# Altium footprint library MainFPs.PcbLib: 206 footprints (part 13 of 13)
Each footprint in its own frame and in the unit in brackets; x right, y up, seen from the top. Pads: shape width x height; smd on the part's side, far side on the other; paste and mask are expansions set on the pad; w line width, h text height; cw(c..) or ccw(c..) is an arc to the next point about the centre after c.
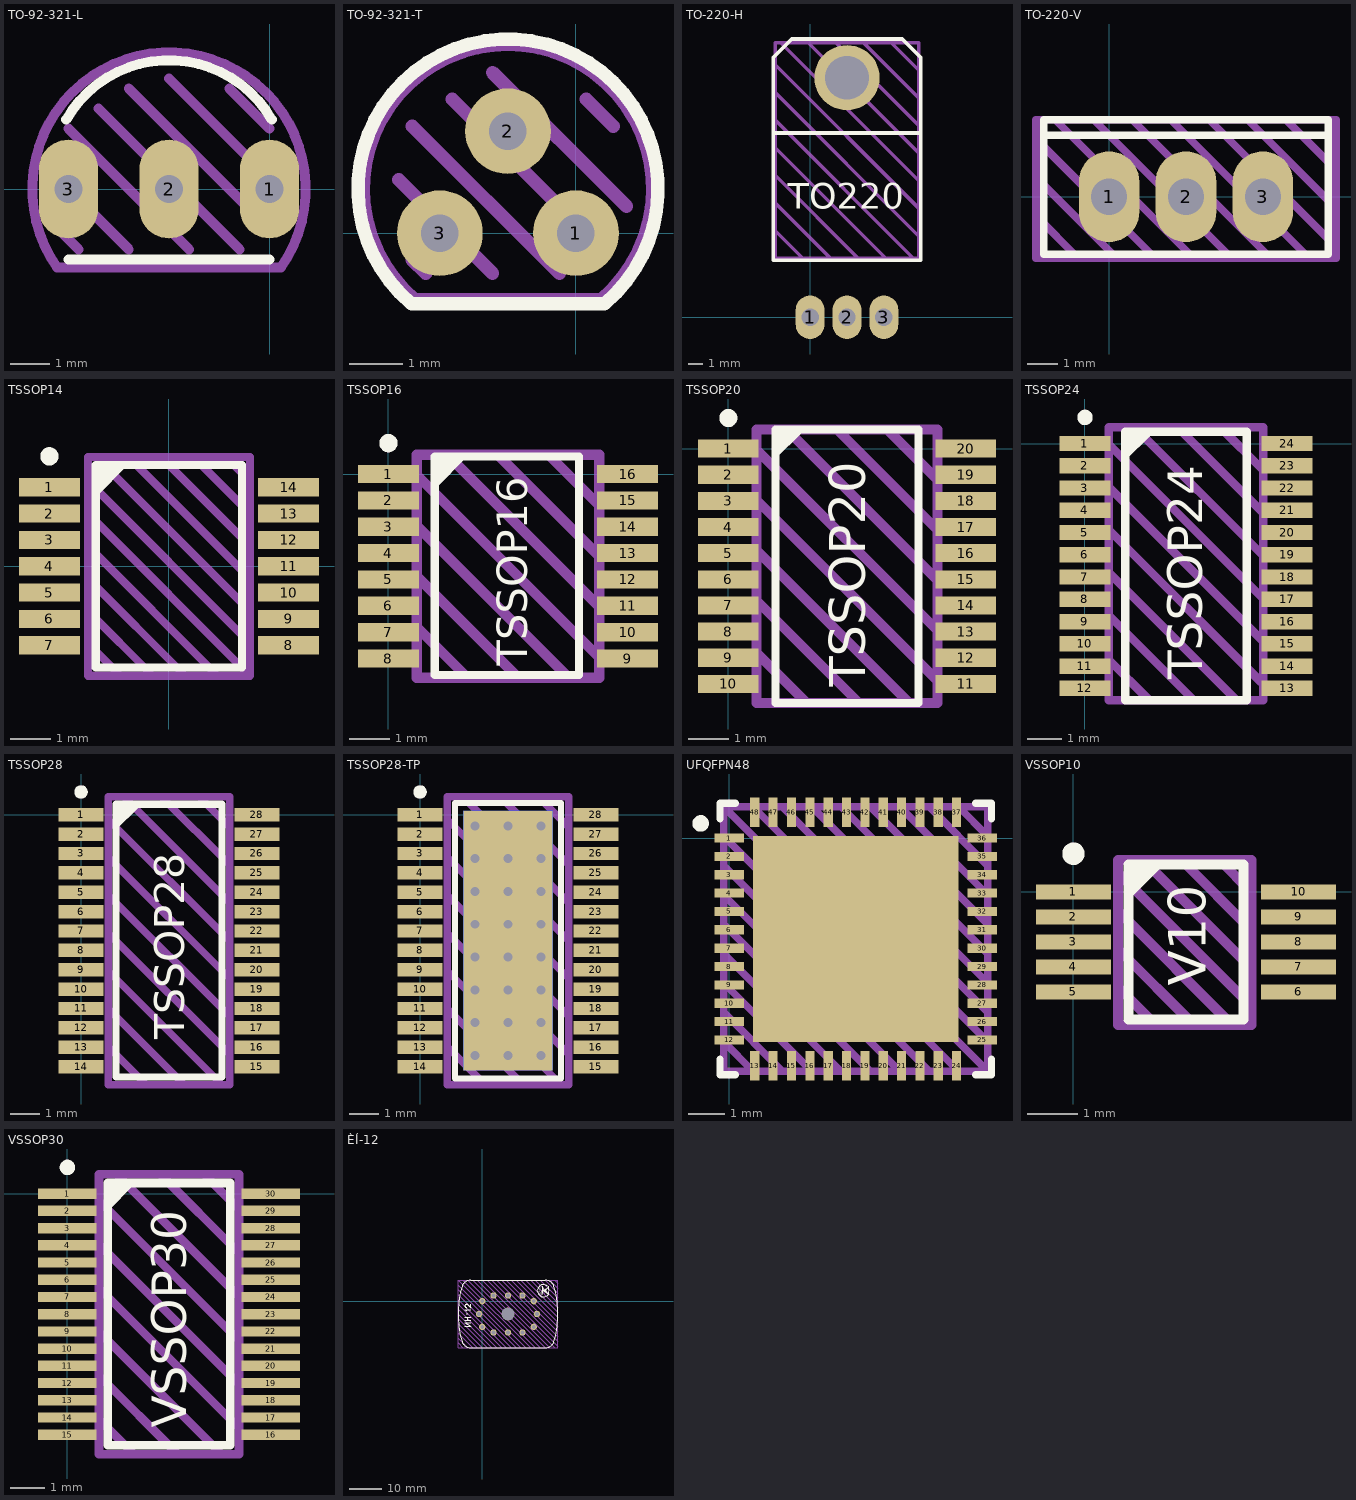
[diagram p12: the footprints below, top view; thin cyan lines are the x and y axes]

## TO-92-321-L [mm]
pads (3):
  oval 1.5x2.5 hole 0.7: 1(0,0) 2(-2.54,0) 3(-5.08,0)
Top Overlay:
  lines w0.25: -5.138,1.754 cw(c-2.54,0.254) 0.058,1.754 ; -5.08,-1.778 0,-1.778
Draw:
  lines w0.25: -5.334,-1.016 -4.826,-1.524 ; -5.334,0.254 -3.556,-1.524 ; -5.08,1.524 -2.032,-1.524 ; -4.318,2.032 -0.762,-1.524 ; -3.556,2.54 0,-1.016 ; -2.54,2.794 0.254,0 ; -1.016,2.54 0,1.524 ; -5.37,-1.982 cw(c-2.54,0) 0.29,-1.982 -5.37,-1.982
Info:
  text "'.Comment'" at -5.715,-3.175 h0.75
3D body: height 2.18, standoff -0.16, extent -5.365,-0.3 -3.555,0.3
3D body: height 3, standoff 2, extent -1.57,-0.3 -0.97,0.3
3D body: height 3, standoff 2, extent -4.109,-0.3 -3.509,0.3
3D body: height 0.3, standoff -0.3, extent -0.299,-0.3 0.301,0.3
3D body: height 0.3, standoff -0.3, extent -5.379,-0.3 -4.779,0.3
3D body: height 5.22, standoff -1.78, extent -2.839,-0.3 -2.239,0.3
3D body: height 0, standoff -1.78, extent -0.299,-0.3 0.301,0.3
3D body: height 0, standoff -1.78, extent -5.379,-0.3 -4.779,0.3
3D body: height 2.3, standoff 1.7, extent -1.57,-0.3 -0.97,0.3
3D body: height 2.3, standoff 1.7, extent -4.109,-0.3 -3.509,0.3
3D body: height 2.18, standoff -0.16, extent -1.525,-0.3 0.285,0.3
3D body: height 7, standoff 3, extent -5.058,-1.422 -2.537,2.997
3D body: height 7, standoff 3, extent -2.54,-1.422 -0.019,2.997

## TO-92-321-T [mm]
pads (3):
  round 1.6 hole 0.7: 1(0,0) 2(-1.27,1.905) 3(-2.54,0)
Top Overlay:
  lines w0.25: -3.068,-1.319 cw(c-1.269,0.826) 0.531,-1.319 -3.068,-1.319
Draw:
  lines w0.25: -3.307,1 -1.557,-0.75 ; -3.057,-0.5 -2.807,-0.75 ; -3.057,2 -0.307,-0.75 ; -2.307,2.5 0.443,-0.25 ; -1.557,3 0.943,0.5 ; 0.193,2.5 0.693,2 ; -2.807,-0.75 -2.807,-0.75 ; -3.004,-1.243 cw(c-1.269,0.826) 0.467,-1.243 -3.004,-1.243
Info:
  text "'.Comment'" at -4.445,-2.54 h0.75
3D body: height 7, standoff 3, extent -3.79,-0.787 -1.268,3.632
3D body: height 7, standoff 3, extent -1.271,-0.787 1.25,3.632
3D body: height 2.17, standoff -0.13, extent -1.569,0.682 -0.969,2.177
3D body: height 2.16, standoff -0.13, extent -2.84,-0.27 -2.24,1.246
3D body: height 0, standoff -1.78, extent -0.3,-0.3 0.3,0.3
3D body: height 0.3, standoff -0.3, extent -0.3,-0.3 0.3,0.3
3D body: height 0, standoff -1.78, extent -2.84,-0.3 -2.24,0.3
3D body: height 0.3, standoff -0.3, extent -2.84,-0.3 -2.24,0.3
3D body: height 2.3, standoff 1.7, extent -1.57,0.665 -0.97,1.265
3D body: height 0.3, standoff -0.3, extent -1.569,1.605 -0.969,2.205
3D body: height 0, standoff -1.78, extent -1.569,1.605 -0.969,2.205
3D body: height 3, standoff 2, extent -0.301,0.665 0.299,1.265
3D body: height 3, standoff 2, extent -2.839,0.666 -2.239,1.266
3D body: height 3, standoff 2, extent -1.57,0.665 -0.97,1.265
3D body: height 2.3, standoff 1.7, extent -0.301,0.665 0.299,1.265
3D body: height 2.3, standoff 1.7, extent -2.839,0.666 -2.239,1.266
3D body: height 2.16, standoff -0.13, extent -0.3,-0.27 0.3,1.246

## TO-220-H [mm]
pads (4):
  oval 2x3 hole 1.2: 1(0,0) 2(2.54,0) 3(5.08,0)
  round 4.5 hole 3: ""(2.54,16.51)
Top Overlay:
  lines w0.25: -2.54,12.7 7.6,12.7 ; -2.54,3.937 7.62,3.937 7.62,17.907 6.35,19.177 -1.27,19.177 -2.54,17.907 -2.54,3.937
  text "TO220" at -1.555,7.462 h1.75
Draw:
  lines w0.25: -2.413,5.969 -0.508,4.064 ; -2.413,7.874 1.397,4.064 ; -2.413,9.779 3.302,4.064 ; -2.413,11.684 5.207,4.064 ; -2.413,13.589 7.112,4.064 ; -2.413,15.494 7.493,5.588 ; -2.413,17.399 7.429,7.556 ; -2.032,18.923 7.493,9.398 ; -0.127,18.923 7.461,11.335 ; 1.778,18.923 7.493,13.208 ; 3.683,18.923 7.493,15.113 ; 5.588,18.923 7.493,17.018 ; -2.413,4.064 7.493,4.064 7.493,18.669 7.493,18.923 -2.413,18.923 -2.413,4.064
Info:
  text "'.Comment'" at -2.413,-3.175 h1.25
3D body: height 1.27, standoff 0, extent -2.3,6.3 7.3,18.8
3D body: height 2.2, standoff 1.8, extent -0.762,-0.254 0.762,4
3D body: height 2.2, standoff 1.8, extent 1.778,-0.254 3.302,4
3D body: height 2.2, standoff 1.8, extent 4.318,-0.254 5.842,4
3D body: height 2, standoff -1.78, extent -0.254,-0.254 0.254,0.254
3D body: height 2, standoff -1.78, extent 2.286,-0.254 2.794,0.254
3D body: height 3, standoff 0.01, extent -2.6,3.999 7.6,12.7
3D body: height 2, standoff -1.78, extent 4.826,-0.254 5.334,0.254

## TO-220-V [mm]
pads (3):
  oval 2x3 hole 1.2: 1(0,0) 2(2.54,0) 3(5.08,0)
Top Overlay:
  lines w0.25: -2.159,2.032 0,2.032 5.08,2.032 7.239,2.032 ; -2.159,-1.905 0,-1.905 5.08,-1.905 7.239,-1.905 7.239,2.54 -2.159,2.54 -2.159,0.921 -2.159,-1.048 -2.159,-1.905
Draw:
  lines w0.25: -2.413,-0.635 -1.016,-2.032 0.254,-2.032 -2.413,0.635 ; -2.413,1.778 -2.413,2.54 -2.286,2.54 0,2.54 ; -2.413,1.905 1.524,-2.032 2.794,-2.032 -1.778,2.54 ; -2.413,2.032 -2.413,1.016 -2.413,-1.016 -2.413,-2.032 7.493,-2.032 7.493,2.54 5.08,2.54 ; -1.27,2.54 0,2.54 ; -0.508,2.54 3.81,-1.778 4.064,-2.032 ; 0.508,2.54 0.762,2.54 5.334,-2.032 ; 1.27,2.54 2.54,2.54 ; 2.032,2.54 6.604,-2.032 ; 3.302,2.54 7.493,-1.651 ; 3.81,2.54 5.08,2.54 ; 4.572,2.54 7.493,-0.381 7.493,0.889 5.842,2.54 ; 0,2.54 5.08,2.54
Info:
  text "'.Comment'" at -2.286,-3.556 h1
3D body: height 13, standoff 3.9, extent -2.575,-0.819 7.625,2.237
3D body: height 4, standoff 0.49, extent 4.445,-0.381 5.715,0.381
3D body: height 4, standoff 0.49, extent 1.905,-0.381 3.175,0.381
3D body: height 0.5, standoff -3, extent 4.699,-0.254 5.461,0.254
3D body: height 0.5, standoff -3, extent 2.159,-0.254 2.921,0.254
3D body: height 0.5, standoff -3, extent -0.381,-0.254 0.381,0.254
3D body: height 4, standoff 0.49, extent -0.635,-0.381 0.635,0.381
3D body: height 18.75, standoff 6.25, extent -2.275,0.989 7.325,2.259

## TSSOP14 [mm]
height 1.2
pads (14):
  rect 1.5x0.45 smd: 1(-2.95,1.95) 2(-2.95,1.3) 3(-2.95,0.65) 4(-2.95,0) 5(-2.95,-0.65) 6(-2.95,-1.3) 7(-2.95,-1.95) 8(2.95,-1.95) 9(2.95,-1.3) 10(2.95,-0.65) 11(2.95,0) 12(2.95,0.65) 13(2.95,1.3) 14(2.95,1.95)
Top Overlay:
  circle w0.25: c-2.95,2.712 r0.1
  region: -1.807,2.5 -1.807,1.706 -1.013,2.5
  lines w0.2: -1.807,-2.5 1.8,-2.5 1.8,2.5 -1.807,2.5 -1.807,-2.5
Draw:
  lines w0.2: -2,-1.9 -1.2,-2.7 ; -2,-1.1 -0.4,-2.7 ; -2,-0.3 0.4,-2.7 ; -2,0.5 1.2,-2.7 ; -2,1.3 2,-2.7 ; -2,2.1 2,-1.9 ; -1.8,2.7 2,-1.1 ; -1,2.7 2,-0.3 ; -0.2,2.7 2,0.5 ; 0.6,2.7 2,1.3 ; 1.4,2.7 2,2.1 ; 2,-2.7 2,2.7 -2,2.7 -2,-2.7 2,-2.7
Info:
  text "'.Comment'" at -3.204,-3.638 h0.75
3D body "TSOP65P640X120-14N.step": height 1.2, standoff 0, extent -3.2,-2.7 3.2,2.7

## TSSOP16 [mm]
height 1.2
pads (16):
  rect 1.5x0.45 smd: 1(0,0) 2(0,-0.65) 3(0,-1.3) 4(0,-1.95) 5(0,-2.6) 6(0,-3.25) 7(0,-3.9) 8(0,-4.55) 9(5.9,-4.55) 10(5.9,-3.9) 11(5.9,-3.25) 12(5.9,-2.6) 13(5.9,-1.95) 14(5.9,-1.3) 15(5.9,-0.65) 16(5.9,0)
Top Overlay:
  circle w0.25: c0,0.762 r0.1
  region: 1.15,0.435 1.15,-0.359 1.944,0.435
  lines w0.2: 1.143,-4.953 4.699,-4.953 4.699,0.435 1.143,0.435 1.143,-4.953
  text "TSSOP16" at 3.423,-4.723 h0.75
Draw:
  lines w0.25: 0.7,-3.775 1.95,-5.025 ; 0.7,-2.525 3.2,-5.025 3.45,-5.025 ; 0.7,-1.275 4.45,-5.025 ; 0.7,-0.025 5.2,-4.525 ; 1.45,0.475 5.2,-3.275 5.2,-4.525 ; 2.7,0.475 5.2,-2.025 5.2,-3.525 ; 3.991,0.435 5.2,-0.775 5.2,-1.275 ; 5.2,-5.025 0.7,-5.025 0.7,0.475 5.2,0.475 5.2,-5.025 ; 5.2,-5.025 5.2,-4.525
Info:
  text "'.Comment'" at -0.254,-6.096 h0.75
3D body "TSSOP16.step": height 1.2, standoff 0, extent -0.3,-4.825 6.2,0.275

## TSSOP20 [mm]
height 1.3
pads (20):
  rect 1.5x0.45 smd: 1(0,0) 2(0,-0.65) 3(0,-1.3) 4(0,-1.95) 5(0,-2.6) 6(0,-3.25) 7(0,-3.9) 8(0,-4.55) 9(0,-5.2) 10(0,-5.85) 11(5.9,-5.85) 12(5.9,-5.2) 13(5.9,-4.55) 14(5.9,-3.9) 15(5.9,-3.25) 16(5.9,-2.6) 17(5.9,-1.95) 18(5.9,-1.3) 19(5.9,-0.65) 20(5.9,0)
Top Overlay:
  circle w0.25: c0,0.762 r0.1
  region: 1.1,0.475 1.1,-0.319 1.894,0.475
  lines w0.2: 1.172,-6.325 1.172,0.475 4.728,0.475 4.728,-6.325 1.172,-6.325
  text "TSSOP20" at 3.4,-5.924 h0.9
Draw:
  lines w0.25: 0.7,-4.925 0.7,-5.075 0.8,-5.175 1.95,-6.325 ; 0.7,-3.775 3.25,-6.325 3.45,-6.325 ; 0.7,-2.525 4.475,-6.3 ; 0.7,-1.275 5.15,-5.725 ; 0.7,-0.025 5.2,-4.525 ; 1.45,0.475 5.2,-3.275 5.2,-4.525 ; 2.7,0.475 5.2,-2.025 5.2,-3.525 ; 3.95,0.475 5.2,-0.775 5.2,-1.275 ; 5.2,-5.025 5.2,0.475 0.7,0.475 0.7,-6.325 5.2,-6.325 5.2,-4.525
Info:
  text "'.Comment'" at -0.186,-7.537 h0.75
3D body "TSOP65P640X120-16N.step": height 1.2, standoff 0, extent -0.275,-4.775 6.125,0.225
3D body "TSOP65P640X120-16N.step": height 1.2, standoff 0, extent -0.275,-6.075 6.125,-1.075

## TSSOP24 [mm]
height 1.2
pads (24):
  rect 1.5x0.45 smd: 1(0,0) 2(0,-0.65) 3(0,-1.3) 4(0,-1.95) 5(0,-2.6) 6(0,-3.25) 7(0,-3.9) 8(0,-4.55) 9(0,-5.2) 10(0,-5.85) 11(0,-6.5) 12(0,-7.15) 13(5.9,-7.15) 14(5.9,-6.5) 15(5.9,-5.85) 16(5.9,-5.2) 17(5.9,-4.55) 18(5.9,-3.9) 19(5.9,-3.25) 20(5.9,-2.6) 21(5.9,-1.95) 22(5.9,-1.3) 23(5.9,-0.65) 24(5.9,0)
Top Overlay:
  circle w0.25: c0,0.762 r0.1
  region: 1.15,0.275 1.15,-0.519 1.944,0.275
  lines w0.25: 1.172,-7.493 1.172,0.347 4.728,0.347 4.728,-7.493 1.172,-7.493
  text "TSSOP24" at 3.421,-6.888 h1
Draw:
  lines w0.25: 0.7,-6.325 1.861,-7.486 ; 0.7,-5.075 0.7,-4.925 ; 0.7,-5.025 3.168,-7.493 3.302,-7.493 ; 0.7,-3.775 4.419,-7.494 ; 0.7,-2.525 5.15,-6.975 ; 0.7,-1.275 5.15,-5.725 ; 0.7,-0.025 5.2,-4.525 ; 1.45,0.475 5.2,-3.275 5.2,-4.525 ; 2.7,0.475 5.2,-2.025 5.2,-3.525 ; 3.95,0.475 5.2,-0.775 5.2,-1.275 ; 5.2,-5.025 5.2,0.475 0.7,0.475 0.7,-7.493 5.2,-7.493 5.2,-4.525
Info:
  text "'.Comment'" at -0.186,-8.637 h0.75
3D body "TSOP65P640X120-24N.step": height 1.2, standoff 0, extent -0.25,-7.525 6.15,0.375

## TSSOP28 [mm]
height 1.2
pads (28):
  rect 1.5x0.45 smd: 1(0,0) 2(0,-0.65) 3(0,-1.3) 4(0,-1.95) 5(0,-2.6) 6(0,-3.25) 7(0,-3.9) 8(0,-4.55) 9(0,-5.2) 10(0,-5.85) 11(0,-6.5) 12(0,-7.15) 13(0,-7.8) 14(0,-8.45) 15(5.9,-8.45) 16(5.9,-7.8) 17(5.9,-7.15) 18(5.9,-6.5) 19(5.9,-5.85) 20(5.9,-5.2) 21(5.9,-4.55) 22(5.9,-3.9) 23(5.9,-3.25) 24(5.9,-2.6) 25(5.9,-1.95) 26(5.9,-1.3) 27(5.9,-0.65) 28(5.9,0)
Top Overlay:
  circle w0.25: c0,0.762 r0.1
  region: 1.15,0.275 1.15,-0.519 1.944,0.275
  lines w0.25: 1.172,-8.797 1.172,0.347 4.728,0.347 4.728,-8.797 1.172,-8.797
  text "TSSOP28" at 3.458,-7.527 h1
Draw:
  lines w0.25: 0.918,-7.781 2.188,-9.051 ; 0.918,-6.511 3.458,-9.051 ; 0.918,-5.241 4.728,-9.051 ; 0.918,-3.971 4.982,-8.035 ; 0.918,-2.701 4.982,-6.765 ; 0.918,-1.431 4.982,-5.495 ; 0.918,-0.161 4.982,-4.225 ; 1.426,0.601 4.982,-2.955 ; 2.696,0.601 4.982,-1.685 ; 3.966,0.601 4.982,-0.415 ; 0.918,-9.051 0.918,0.347 0.918,0.601 1.172,0.601 4.982,0.601 4.982,-9.051 0.918,-9.051
Info:
  text "'.Comment'" at -0.186,-10.237 h0.75
3D body "TSSOP28.step": height 1.2, standoff 0, extent -0.25,-9.125 6.15,0.675

## TSSOP28-TP [mm]
height 1.2
pads (30):
  rect 1.5x0.45 smd: 1(0,0) 2(0,-0.65) 3(0,-1.3) 4(0,-1.95) 5(0,-2.6) 6(0,-3.25) 7(0,-3.9) 8(0,-4.55) 9(0,-5.2) 10(0,-5.85) 11(0,-6.5) 12(0,-7.15) 13(0,-7.8) 14(0,-8.45) 15(5.9,-8.45) 16(5.9,-7.8) 17(5.9,-7.15) 18(5.9,-6.5) 19(5.9,-5.85) 20(5.9,-5.2) 21(5.9,-4.55) 22(5.9,-3.9) 23(5.9,-3.25) 24(5.9,-2.6) 25(5.9,-1.95) 26(5.9,-1.3) 27(5.9,-0.65) 28(5.9,0)
  rect 3x8.7 smd: ""(2.95,-4.225)
  rect 3x8.7 smd far side: ""(2.95,-4.225)
via 1.85,-0.375 diameter 0.5 hole 0.3
via 2.95,-0.375 diameter 0.5 hole 0.3
via 4.05,-0.375 diameter 0.5 hole 0.3
via 2.95,-1.475 diameter 0.5 hole 0.3
via 4.05,-1.475 diameter 0.5 hole 0.3
via 2.95,-2.575 diameter 0.5 hole 0.3
via 4.05,-2.575 diameter 0.5 hole 0.3
via 4.05,-3.675 diameter 0.5 hole 0.3
via 4.05,-4.775 diameter 0.5 hole 0.3
via 4.05,-5.875 diameter 0.5 hole 0.3
via 4.05,-6.975 diameter 0.5 hole 0.3
via 4.05,-8.075 diameter 0.5 hole 0.3
via 1.85,-5.875 diameter 0.5 hole 0.3
via 1.85,-1.475 diameter 0.5 hole 0.3
via 1.85,-2.575 diameter 0.5 hole 0.3
via 1.85,-3.675 diameter 0.5 hole 0.3
via 1.85,-4.775 diameter 0.5 hole 0.3
via 1.85,-6.975 diameter 0.5 hole 0.3
via 1.85,-8.075 diameter 0.5 hole 0.3
via 2.95,-8.075 diameter 0.5 hole 0.3
via 2.95,-3.675 diameter 0.5 hole 0.3
via 2.95,-4.775 diameter 0.5 hole 0.3
via 2.95,-5.875 diameter 0.5 hole 0.3
via 2.95,-6.975 diameter 0.5 hole 0.3
Top Overlay:
  circle w0.25: c0,0.762 r0.1
  lines w0.2: 1.172,-8.85 1.172,0.398 4.728,0.398 4.728,-8.85 1.172,-8.85
Draw:
  lines w0.25: 0.918,-7.781 2.188,-9.051 ; 0.918,-6.511 3.458,-9.051 ; 0.918,-5.241 4.728,-9.051 ; 0.918,-3.971 4.982,-8.035 ; 0.918,-2.701 4.982,-6.765 ; 0.918,-1.431 4.982,-5.495 ; 0.918,-0.161 4.982,-4.225 ; 1.426,0.601 4.982,-2.955 ; 2.696,0.601 4.982,-1.685 ; 3.966,0.601 4.982,-0.415 ; 0.918,-9.051 4.982,-9.051 4.982,0.601 1.172,0.601 0.918,0.601 0.918,0.347 0.918,-9.051
Info:
  text "'.Comment'" at -0.186,-10.237 h0.75
3D body "TSSOP-28.step": height 1.2, standoff 0, extent -0.25,-9.125 6.15,0.675

## UFQFPN48 [mm]
pads (49):
  rect 0.8x0.25 smd: 1(0,0) 2(0,-0.5) 3(0,-1) 4(0,-1.5) 5(0,-2) 6(0,-2.5) 7(0,-3) 8(0,-3.5) 9(0,-4) 10(0,-4.5) 11(0,-5) 12(0,-5.5) 25(6.9,-5.5) 26(6.9,-5) 27(6.9,-4.5) 28(6.9,-4) 29(6.9,-3.5) 30(6.9,-3) 31(6.9,-2.5) 32(6.9,-2) 33(6.9,-1.5) 34(6.9,-1) 35(6.9,-0.5) 36(6.9,0)
  rect 0.25x0.8 smd: 13(0.7,-6.2) 14(1.2,-6.2) 15(1.7,-6.2) 16(2.2,-6.2) 17(2.7,-6.2) 18(3.2,-6.2) 19(3.7,-6.2) 20(4.2,-6.2) 21(4.7,-6.2) 22(5.2,-6.2) 23(5.7,-6.2) 24(6.2,-6.2) 37(6.2,0.7) 38(5.7,0.7) 39(5.2,0.7) 40(4.7,0.7) 41(4.2,0.7) 42(3.7,0.7) 43(3.2,0.7) 44(2.7,0.7) 45(2.2,0.7) 46(1.7,0.7) 47(1.2,0.7) 48(0.7,0.7)
  rect 5.6x5.6 smd: ""(3.45,-2.75)
Top Overlay:
  circle w0.25: c-0.775,0.4 r0.1
  lines w0.2: -0.25,-6.025 -0.25,-6.45 0.175,-6.45 ; -0.25,0.525 -0.25,0.95 0.175,0.95 ; 6.725,-6.45 7.15,-6.45 7.15,-6.025 ; 6.725,0.95 7.15,0.95 7.15,0.525
Draw:
  lines w0.2: -0.15,-5.55 0.65,-6.35 ; -0.15,-4.75 1.45,-6.35 ; -0.15,-3.95 2.25,-6.35 ; -0.15,-3.15 3.05,-6.35 ; -0.15,-2.35 3.85,-6.35 ; -0.15,-1.55 4.65,-6.35 ; -0.15,-0.75 5.45,-6.35 ; -0.15,0.05 6.25,-6.35 ; 0.65,0.85 7.05,-5.55 ; 1.45,0.85 7.05,-4.75 ; 2.25,0.85 7.05,-3.95 ; 3.05,0.85 7.05,-3.15 ; 3.85,0.85 7.05,-2.35 ; 4.65,0.85 7.05,-1.55 ; 5.45,0.85 7.05,-0.75 ; 6.25,0.85 7.05,0.05 ; -0.15,0.85 -0.15,-6.35 7.05,-6.35 ; -0.15,0.85 7.05,0.85 7.05,-6.35 ; -0.15,0.85 7.05,-6.35
Info:
  text "'.Comment'" at 0.264,-7.787 h0.75
3D body "QFN50P700X700X60_HS-49N.step": height 0.6, standoff 0, extent -0.11,-6.31 7.01,0.81

## VSSOP10 [mm]
height 1.1
pads (10):
  rect 1.5x0.3 smd: 1(0,0) 2(0,-0.5) 3(0,-1) 4(0,-1.5) 5(0,-2) 6(4.5,-2) 7(4.5,-1.5) 8(4.5,-1) 9(4.5,-0.5) 10(4.5,0)
Top Overlay:
  circle w0.25: c0,0.762 r0.1
  region: 1.107,0.54 1.107,-0.163 1.81,0.54
  lines w0.2: 1.1,-2.55 3.4,-2.55 3.4,0.55 1.1,0.55 1.1,-2.55
  text "V10" at 2.644,-1.882 h0.75
Draw:
  lines w0.2: 0.889,-1.905 1.651,-2.667 ; 0.889,-1.143 2.413,-2.667 ; 0.889,-0.381 3.175,-2.667 ; 0.889,0.381 3.556,-2.286 ; 1.397,0.635 3.556,-1.524 ; 2.159,0.635 3.556,-0.762 ; 2.921,0.635 3.556,0 ; 0.889,-2.667 0.889,0.635 3.556,0.635 3.556,-2.667 0.889,-2.667
Info:
  text "'.Comment'" at 0.176,-3.492 h0.5
3D body "VSSOP10.step": height 1.1, standoff 0, extent -0.262,-2.55 4.763,0.55

## VSSOP30 [mm]
height 1.2
pads (30):
  rect 1.7x0.3 smd: 1(0,0) 2(0,-0.5) 3(0,-1) 4(0,-1.5) 5(0,-2) 6(0,-2.5) 7(0,-3) 8(0,-3.5) 9(0,-4) 10(0,-4.5) 11(0,-5) 12(0,-5.5) 13(0,-6) 14(0,-6.5) 15(0,-7) 16(5.9,-7) 17(5.9,-6.5) 18(5.9,-6) 19(5.9,-5.5) 20(5.9,-5) 21(5.9,-4.5) 22(5.9,-4) 23(5.9,-3.5) 24(5.9,-3) 25(5.9,-2.5) 26(5.9,-2) 27(5.9,-1.5) 28(5.9,-1) 29(5.9,-0.5) 30(5.9,0)
Top Overlay:
  circle w0.25: c0,0.762 r0.1
  region: 1.15,0.275 1.15,-0.519 1.944,0.275
  lines w0.25: 1.172,-7.31 4.728,-7.31 4.728,0.31 1.172,0.31 1.172,-7.31
  text "VSSOP30" at 3.458,-6.802 h1
Draw:
  lines w0.25: 0.918,-6.548 1.934,-7.564 ; 0.918,-5.278 3.204,-7.564 ; 0.918,-4.008 4.474,-7.564 ; 0.918,-2.738 4.982,-6.802 ; 0.918,-1.468 4.982,-5.532 ; 0.918,-0.198 4.982,-4.262 ; 1.426,0.564 4.982,-2.992 ; 2.696,0.564 4.982,-1.722 ; 3.966,0.564 4.982,-0.452 ; 0.918,-7.564 4.982,-7.564 4.982,0.564 1.172,0.564 0.918,0.564 0.918,0.31 0.918,-7.564
Info:
  text "'.Comment'" at -0.186,-8.637 h0.75
3D body "TSSOP30.step": height 1.2, standoff 0, extent -0.25,-7.45 6.15,0.45

## ÈÍ-12 [mm]
pads (13):
  round 2 hole 1.2: 1(0,0) 2(3.5,1.75) 3(8,1.75) 4(12.5,1.75) 5(16,0) 6(17,-4) 7(16,-8) 8(12.5,-9.75) 9(8,-9.75) 10(3.5,-9.75) 11(0,-8) 12(-1,-4)
  round 0 hole 4 unplated: ""(8,-4)
Top Layer:
  circle w0.2: c8,-4 r1.75
Top Overlay:
  region: 20.35,2.275 19,3.25 20.35,4.225 19.525,3.275
  region: 19,3.25 18.575,1.925 18.675,3.25 18.575,4.575
  lines w0.05: 19,3.25 18.575,1.925 18.675,3.25 18.575,4.575 19,3.25 ; 19,3.25 20.35,4.225 19.525,3.275 20.35,2.275 19,3.25
  lines w0.127: 17,3.25 cw(c20.655,2.048) 18.382,5.152 cw(c18.471,1.622) 20.618,4.426 cw(c15.448,3.25) 20.618,2.074 cw(c18.792,3.891) 18.382,1.348 cw(c20.655,4.453) 17,3.25
  lines w0.2: -5.375,-7.75 -3.625,-7.75 -5.375,-6.75 -3.625,-6.75 ; -5.375,-6 -3.625,-6 ; -5.375,-5 -3.625,-5 ; -4.875,-3 -5.375,-2.75 -3.625,-2.75 ; -4.875,-2 cw(c-4.875,-1.5) -5.375,-1.5 cw(c-4.875,-1.5) -4.875,-1 cw(c-4.875,-1.604) -4.448,-1.177 -3.625,-2 -3.625,-1 ; -4.625,-4.25 -4.625,-3.75 ; -4.5,-6 -4.5,-5 ; -6.285,-12.614 cw(c23.552,-4) -6.285,4.614 cw(c-3.5,3.5) -3.5,6.5 19.5,6.5 cw(c19.5,3.5) 22.285,4.614 cw(c-7.552,-4) 22.285,-12.614 cw(c19.5,-11.5) 19.5,-14.5 -3.5,-14.5 cw(c-3.5,-11.5) -6.285,-12.614
  text "C" at 18.35,2.283 h0.4
  text "C" at 18.01,3.406 h0.4
  text "C" at 18.084,2.819 h0.4
  text "P" at 18.207,3.97 h0.4
Draw:
  lines w0.2: -7.5,-13 -6,-14.5 ; -7.5,-11.5 -4.5,-14.5 ; -7.5,-10 -3,-14.5 ; -7.5,-8.5 -1.5,-14.5 ; -7.5,-7 0,-14.5 ; -7.5,-5.5 1.5,-14.5 ; -7.5,-4 3,-14.5 ; -7.5,-2.5 4.5,-14.5 ; -7.5,-1 6,-14.5 ; -7.5,0.5 7.5,-14.5 ; -7.5,2 9,-14.5 ; -7.5,3.5 10.5,-14.5 ; -7.5,5 12,-14.5 ; -6,6.5 15,-14.5 ; -4.5,6.5 16.5,-14.5 ; -3,6.5 18,-14.5 ; -1.5,6.5 19.5,-14.5 ; 0,6.5 21,-14.5 ; 1.5,6.5 22.5,-14.5 ; 3,6.5 23.5,-14 ; 4.5,6.5 23.5,-12.5 ; 6,6.5 23.5,-11 ; 7.5,6.5 23.5,-9.5 ; 9,6.5 23.5,-8 ; 10.5,6.5 23.5,-6.5 ; 12,6.5 23.5,-5 ; 13.5,-14.5 -7.5,6.5 ; 13.5,6.5 23.5,-3.5 ; 15,6.5 23.5,-2 ; 16.5,6.5 23.5,-0.5 ; 18,6.5 23.5,1 ; 19.5,6.5 23.5,2.5 ; 21,6.5 23.5,4 ; 22.5,6.5 23.5,5.5 ; -7.5,6.5 23.5,6.5 23.5,-14.5 -7.5,-14.5 -7.5,6.5
Info:
  text "'.Comment'" at -0.497,-17.366 h2
3D body "ÈÍ-12_Êîëáà.STEP": height 26.8, standoff -6.2, extent -7,-14 23,6
3D body "ÈÍ-12_Âíóòðåííîñòè.STEP": height 20, standoff -9.5, extent -4.5,-12.619 20.5,4.619